# Altium footprint library Connector_Samtec_HLE_SMD.PcbLib: 290 footprints (part 16 of 24) (continued)
## Samtec_HLE-139-02-xxx-DV-BE-LC_2x39_P2.54mm_Horizontal [mm] (continued)
F.CrtYd:
  lines w0.05: -50.03,-4.06 50.03,-4.06 50.03,4.06 -50.03,4.06 -50.03,-4.06
F.Fab:
  lines w0.1: -48.76,2.54 -48.26,1.833 -47.76,2.54 ; -49.53,-2.54 -49.53,2.54 49.53,2.54 49.53,-2.54 -49.53,-2.54
  text "'.Designator'" at -4.047,-2.68 h1

## Samtec_HLE-139-02-xxx-DV-BE_2x39_P2.54mm_Horizontal [mm]
pads (156):
  rect 1.27x1.68 smd: 1(-48.26,2.72) 2(-48.26,-2.72) 3(-45.72,2.72) 4(-45.72,-2.72) 5(-43.18,2.72) 6(-43.18,-2.72) 7(-40.64,2.72) 8(-40.64,-2.72) 9(-38.1,2.72) 10(-38.1,-2.72) 11(-35.56,2.72) 12(-35.56,-2.72) 13(-33.02,2.72) 14(-33.02,-2.72) 15(-30.48,2.72) 16(-30.48,-2.72) 17(-27.94,2.72) 18(-27.94,-2.72) 19(-25.4,2.72) 20(-25.4,-2.72) 21(-22.86,2.72) 22(-22.86,-2.72) 23(-20.32,2.72) 24(-20.32,-2.72) 25(-17.78,2.72) 26(-17.78,-2.72) 27(-15.24,2.72) 28(-15.24,-2.72) 29(-12.7,2.72) 30(-12.7,-2.72) 31(-10.16,2.72) 32(-10.16,-2.72) 33(-7.62,2.72) 34(-7.62,-2.72) 35(-5.08,2.72) 36(-5.08,-2.72) 37(-2.54,2.72) 38(-2.54,-2.72) 39(0,2.72) 40(0,-2.72) 41(2.54,2.72) 42(2.54,-2.72) 43(5.08,2.72) 44(5.08,-2.72) 45(7.62,2.72) 46(7.62,-2.72) 47(10.16,2.72) 48(10.16,-2.72) 49(12.7,2.72) 50(12.7,-2.72) 51(15.24,2.72) 52(15.24,-2.72) 53(17.78,2.72) 54(17.78,-2.72) 55(20.32,2.72) 56(20.32,-2.72) 57(22.86,2.72) 58(22.86,-2.72) 59(25.4,2.72) 60(25.4,-2.72) 61(27.94,2.72) 62(27.94,-2.72) 63(30.48,2.72) 64(30.48,-2.72) 65(33.02,2.72) 66(33.02,-2.72) 67(35.56,2.72) 68(35.56,-2.72) 69(38.1,2.72) 70(38.1,-2.72) 71(40.64,2.72) 72(40.64,-2.72) 73(43.18,2.72) 74(43.18,-2.72) 75(45.72,2.72) 76(45.72,-2.72) 77(48.26,2.72) 78(48.26,-2.72)
  round 0.97 hole 0.97: Un1(30.48,-1.27) Un2(-12.7,-1.27) Un3(27.94,-1.27) Un4(-33.02,-1.27) Un5(20.32,-1.27) Un6(10.16,-1.27) Un7(0,-1.27) Un8(-25.4,-1.27) Un9(12.7,-1.27) Un10(48.26,-1.27) Un11(25.4,-1.27) Un12(15.24,-1.27) Un13(-2.54,1.27) Un14(15.24,1.27) Un15(22.86,-1.27) Un16(-43.18,-1.27) Un17(5.08,1.27) Un18(-43.18,1.27) Un19(7.62,-1.27) Un20(-30.48,-1.27) Un21(-10.16,1.27) Un22(-48.26,-1.27) Un23(-20.32,-1.27) Un24(-40.64,-1.27) Un25(-15.24,1.27) Un26(-35.56,-1.27) Un27(-27.94,1.27) Un28(-48.26,1.27) Un29(-38.1,-1.27) Un30(40.64,1.27) Un31(-2.54,-1.27) Un32(10.16,1.27) Un33(17.78,1.27) Un34(-5.08,-1.27) Un35(48.26,1.27) Un36(-12.7,1.27) Un37(38.1,1.27) Un38(-45.72,1.27) Un39(43.18,-1.27) Un40(45.72,-1.27) Un41(-20.32,1.27) Un42(-45.72,-1.27) Un43(30.48,1.27) Un44(-17.78,-1.27) Un45(33.02,1.27) Un46(35.56,-1.27) Un47(22.86,1.27) Un48(-17.78,1.27) Un49(33.02,-1.27) Un50(0,1.27) Un51(40.64,-1.27) Un52(-22.86,1.27) Un53(-25.4,1.27) Un54(-35.56,1.27) Un55(43.18,1.27) Un56(20.32,1.27) Un57(38.1,-1.27) Un58(-15.24,-1.27) Un59(-40.64,1.27) Un60(-5.08,1.27) Un61(17.78,-1.27) Un62(-22.86,-1.27) Un63(-33.02,1.27) Un64(45.72,1.27) Un65(7.62,1.27) Un66(35.56,1.27) Un67(-30.48,1.27) Un68(12.7,1.27) Un69(-10.16,-1.27) Un70(25.4,1.27) Un71(27.94,1.27) Un72(2.54,1.27) Un73(2.54,-1.27) Un74(-38.1,1.27) Un75(5.08,-1.27) Un76(-27.94,-1.27) Un77(-7.62,1.27) Un78(-7.62,-1.27)
F.SilkS:
  lines w0.12: -49.155,-2.65 -49.64,-2.65 -49.64,2.65 -49.155,2.65 -49.155,3.56 ; -47.365,-2.65 -46.615,-2.65 ; -47.365,2.65 -46.615,2.65 ; -44.825,-2.65 -44.075,-2.65 ; -44.825,2.65 -44.075,2.65 ; -42.285,-2.65 -41.535,-2.65 ; -42.285,2.65 -41.535,2.65 ; -39.745,-2.65 -38.995,-2.65 ; -39.745,2.65 -38.995,2.65 ; -37.205,-2.65 -36.455,-2.65 ; -37.205,2.65 -36.455,2.65 ; -34.665,-2.65 -33.915,-2.65 ; -34.665,2.65 -33.915,2.65 ; -32.125,-2.65 -31.375,-2.65 ; -32.125,2.65 -31.375,2.65 ; -29.585,-2.65 -28.835,-2.65 ; -29.585,2.65 -28.835,2.65 ; -27.045,-2.65 -26.295,-2.65 ; -27.045,2.65 -26.295,2.65 ; -24.505,-2.65 -23.755,-2.65 ; -24.505,2.65 -23.755,2.65 ; -21.965,-2.65 -21.215,-2.65 ; -21.965,2.65 -21.215,2.65 ; -19.425,-2.65 -18.675,-2.65 ; -19.425,2.65 -18.675,2.65 ; -16.885,-2.65 -16.135,-2.65 ; -16.885,2.65 -16.135,2.65 ; -14.345,-2.65 -13.595,-2.65 ; -14.345,2.65 -13.595,2.65 ; -11.805,-2.65 -11.055,-2.65 ; -11.805,2.65 -11.055,2.65 ; -9.265,-2.65 -8.515,-2.65 ; -9.265,2.65 -8.515,2.65 ; -6.725,-2.65 -5.975,-2.65 ; -6.725,2.65 -5.975,2.65 ; -4.185,-2.65 -3.435,-2.65 ; -4.185,2.65 -3.435,2.65 ; -1.645,-2.65 -0.895,-2.65 ; -1.645,2.65 -0.895,2.65 ; 0.895,-2.65 1.645,-2.65 ; 0.895,2.65 1.645,2.65 ; 3.435,-2.65 4.185,-2.65 ; 3.435,2.65 4.185,2.65 ; 5.975,-2.65 6.725,-2.65 ; 5.975,2.65 6.725,2.65 ; 8.515,-2.65 9.265,-2.65 ; 8.515,2.65 9.265,2.65 ; 11.055,-2.65 11.805,-2.65 ; 11.055,2.65 11.805,2.65 ; 13.595,-2.65 14.345,-2.65 ; 13.595,2.65 14.345,2.65 ; 16.135,-2.65 16.885,-2.65 ; 16.135,2.65 16.885,2.65 ; 18.675,-2.65 19.425,-2.65 ; 18.675,2.65 19.425,2.65 ; 21.215,-2.65 21.965,-2.65 ; 21.215,2.65 21.965,2.65 ; 23.755,-2.65 24.505,-2.65 ; 23.755,2.65 24.505,2.65 ; 26.295,-2.65 27.045,-2.65 ; 26.295,2.65 27.045,2.65 ; 28.835,-2.65 29.585,-2.65 ; 28.835,2.65 29.585,2.65 ; 31.375,-2.65 32.125,-2.65 ; 31.375,2.65 32.125,2.65 ; 33.915,-2.65 34.665,-2.65 ; 33.915,2.65 34.665,2.65 ; 36.455,-2.65 37.205,-2.65 ; 36.455,2.65 37.205,2.65 ; 38.995,-2.65 39.745,-2.65 ; 38.995,2.65 39.745,2.65 ; 41.535,-2.65 42.285,-2.65 ; 41.535,2.65 42.285,2.65 ; 44.075,-2.65 44.825,-2.65 ; 44.075,2.65 44.825,2.65 ; 46.615,-2.65 47.365,-2.65 ; 46.615,2.65 47.365,2.65 ; 49.155,-2.65 49.64,-2.65 49.64,2.65 49.155,2.65
F.CrtYd:
  lines w0.05: -50.03,-4.06 50.03,-4.06 50.03,4.06 -50.03,4.06 -50.03,-4.06
F.Fab:
  lines w0.1: -48.76,2.54 -48.26,1.833 -47.76,2.54 ; -49.53,-2.54 -49.53,2.54 49.53,2.54 49.53,-2.54 -49.53,-2.54
  text "'.Designator'" at -4.047,-2.68 h1

## Samtec_HLE-139-02-xxx-DV-LC_2x39_P2.54mm_Horizontal [mm]
pads (80):
  rect 1.27x2.29 smd: 1(-48.26,2.525) 2(-48.26,-2.525) 3(-45.72,2.525) 4(-45.72,-2.525) 5(-43.18,2.525) 6(-43.18,-2.525) 7(-40.64,2.525) 8(-40.64,-2.525) 9(-38.1,2.525) 10(-38.1,-2.525) 11(-35.56,2.525) 12(-35.56,-2.525) 13(-33.02,2.525) 14(-33.02,-2.525) 15(-30.48,2.525) 16(-30.48,-2.525) 17(-27.94,2.525) 18(-27.94,-2.525) 19(-25.4,2.525) 20(-25.4,-2.525) 21(-22.86,2.525) 22(-22.86,-2.525) 23(-20.32,2.525) 24(-20.32,-2.525) 25(-17.78,2.525) 26(-17.78,-2.525) 27(-15.24,2.525) 28(-15.24,-2.525) 29(-12.7,2.525) 30(-12.7,-2.525) 31(-10.16,2.525) 32(-10.16,-2.525) 33(-7.62,2.525) 34(-7.62,-2.525) 35(-5.08,2.525) 36(-5.08,-2.525) 37(-2.54,2.525) 38(-2.54,-2.525) 39(0,2.525) 40(0,-2.525) 41(2.54,2.525) 42(2.54,-2.525) 43(5.08,2.525) 44(5.08,-2.525) 45(7.62,2.525) 46(7.62,-2.525) 47(10.16,2.525) 48(10.16,-2.525) 49(12.7,2.525) 50(12.7,-2.525) 51(15.24,2.525) 52(15.24,-2.525) 53(17.78,2.525) 54(17.78,-2.525) 55(20.32,2.525) 56(20.32,-2.525) 57(22.86,2.525) 58(22.86,-2.525) 59(25.4,2.525) 60(25.4,-2.525) 61(27.94,2.525) 62(27.94,-2.525) 63(30.48,2.525) 64(30.48,-2.525) 65(33.02,2.525) 66(33.02,-2.525) 67(35.56,2.525) 68(35.56,-2.525) 69(38.1,2.525) 70(38.1,-2.525) 71(40.64,2.525) 72(40.64,-2.525) 73(43.18,2.525) 74(43.18,-2.525) 75(45.72,2.525) 76(45.72,-2.525) 77(48.26,2.525) 78(48.26,-2.525)
  round 1.19 hole 1.19: Un1(-46.99,0) Un2(46.99,0)
F.SilkS:
  lines w0.12: -49.155,-2.65 -49.64,-2.65 -49.64,2.65 -49.155,2.65 -49.155,3.67 ; -47.365,-2.65 -46.615,-2.65 ; -47.365,2.65 -46.615,2.65 ; -44.825,-2.65 -44.075,-2.65 ; -44.825,2.65 -44.075,2.65 ; -42.285,-2.65 -41.535,-2.65 ; -42.285,2.65 -41.535,2.65 ; -39.745,-2.65 -38.995,-2.65 ; -39.745,2.65 -38.995,2.65 ; -37.205,-2.65 -36.455,-2.65 ; -37.205,2.65 -36.455,2.65 ; -34.665,-2.65 -33.915,-2.65 ; -34.665,2.65 -33.915,2.65 ; -32.125,-2.65 -31.375,-2.65 ; -32.125,2.65 -31.375,2.65 ; -29.585,-2.65 -28.835,-2.65 ; -29.585,2.65 -28.835,2.65 ; -27.045,-2.65 -26.295,-2.65 ; -27.045,2.65 -26.295,2.65 ; -24.505,-2.65 -23.755,-2.65 ; -24.505,2.65 -23.755,2.65 ; -21.965,-2.65 -21.215,-2.65 ; -21.965,2.65 -21.215,2.65 ; -19.425,-2.65 -18.675,-2.65 ; -19.425,2.65 -18.675,2.65 ; -16.885,-2.65 -16.135,-2.65 ; -16.885,2.65 -16.135,2.65 ; -14.345,-2.65 -13.595,-2.65 ; -14.345,2.65 -13.595,2.65 ; -11.805,-2.65 -11.055,-2.65 ; -11.805,2.65 -11.055,2.65 ; -9.265,-2.65 -8.515,-2.65 ; -9.265,2.65 -8.515,2.65 ; -6.725,-2.65 -5.975,-2.65 ; -6.725,2.65 -5.975,2.65 ; -4.185,-2.65 -3.435,-2.65 ; -4.185,2.65 -3.435,2.65 ; -1.645,-2.65 -0.895,-2.65 ; -1.645,2.65 -0.895,2.65 ; 0.895,-2.65 1.645,-2.65 ; 0.895,2.65 1.645,2.65 ; 3.435,-2.65 4.185,-2.65 ; 3.435,2.65 4.185,2.65 ; 5.975,-2.65 6.725,-2.65 ; 5.975,2.65 6.725,2.65 ; 8.515,-2.65 9.265,-2.65 ; 8.515,2.65 9.265,2.65 ; 11.055,-2.65 11.805,-2.65 ; 11.055,2.65 11.805,2.65 ; 13.595,-2.65 14.345,-2.65 ; 13.595,2.65 14.345,2.65 ; 16.135,-2.65 16.885,-2.65 ; 16.135,2.65 16.885,2.65 ; 18.675,-2.65 19.425,-2.65 ; 18.675,2.65 19.425,2.65 ; 21.215,-2.65 21.965,-2.65 ; 21.215,2.65 21.965,2.65 ; 23.755,-2.65 24.505,-2.65 ; 23.755,2.65 24.505,2.65 ; 26.295,-2.65 27.045,-2.65 ; 26.295,2.65 27.045,2.65 ; 28.835,-2.65 29.585,-2.65 ; 28.835,2.65 29.585,2.65 ; 31.375,-2.65 32.125,-2.65 ; 31.375,2.65 32.125,2.65 ; 33.915,-2.65 34.665,-2.65 ; 33.915,2.65 34.665,2.65 ; 36.455,-2.65 37.205,-2.65 ; 36.455,2.65 37.205,2.65 ; 38.995,-2.65 39.745,-2.65 ; 38.995,2.65 39.745,2.65 ; 41.535,-2.65 42.285,-2.65 ; 41.535,2.65 42.285,2.65 ; 44.075,-2.65 44.825,-2.65 ; 44.075,2.65 44.825,2.65 ; 46.615,-2.65 47.365,-2.65 ; 46.615,2.65 47.365,2.65 ; 49.155,-2.65 49.64,-2.65 49.64,2.65 49.155,2.65
F.CrtYd:
  lines w0.05: -50.03,-4.17 50.03,-4.17 50.03,4.17 -50.03,4.17 -50.03,-4.17
F.Fab:
  lines w0.1: -48.76,2.54 -48.26,1.833 -47.76,2.54 ; -49.53,-2.54 49.53,-2.54 49.53,2.54 -49.53,2.54 -49.53,-2.54
  text "'.Designator'" at -4.047,-2.68 h1

## Samtec_HLE-139-02-xxx-DV_2x39_P2.54mm_Horizontal [mm]
pads (78):
  rect 1.27x2.29 smd: 1(-48.26,2.525) 2(-48.26,-2.525) 3(-45.72,2.525) 4(-45.72,-2.525) 5(-43.18,2.525) 6(-43.18,-2.525) 7(-40.64,2.525) 8(-40.64,-2.525) 9(-38.1,2.525) 10(-38.1,-2.525) 11(-35.56,2.525) 12(-35.56,-2.525) 13(-33.02,2.525) 14(-33.02,-2.525) 15(-30.48,2.525) 16(-30.48,-2.525) 17(-27.94,2.525) 18(-27.94,-2.525) 19(-25.4,2.525) 20(-25.4,-2.525) 21(-22.86,2.525) 22(-22.86,-2.525) 23(-20.32,2.525) 24(-20.32,-2.525) 25(-17.78,2.525) 26(-17.78,-2.525) 27(-15.24,2.525) 28(-15.24,-2.525) 29(-12.7,2.525) 30(-12.7,-2.525) 31(-10.16,2.525) 32(-10.16,-2.525) 33(-7.62,2.525) 34(-7.62,-2.525) 35(-5.08,2.525) 36(-5.08,-2.525) 37(-2.54,2.525) 38(-2.54,-2.525) 39(0,2.525) 40(0,-2.525) 41(2.54,2.525) 42(2.54,-2.525) 43(5.08,2.525) 44(5.08,-2.525) 45(7.62,2.525) 46(7.62,-2.525) 47(10.16,2.525) 48(10.16,-2.525) 49(12.7,2.525) 50(12.7,-2.525) 51(15.24,2.525) 52(15.24,-2.525) 53(17.78,2.525) 54(17.78,-2.525) 55(20.32,2.525) 56(20.32,-2.525) 57(22.86,2.525) 58(22.86,-2.525) 59(25.4,2.525) 60(25.4,-2.525) 61(27.94,2.525) 62(27.94,-2.525) 63(30.48,2.525) 64(30.48,-2.525) 65(33.02,2.525) 66(33.02,-2.525) 67(35.56,2.525) 68(35.56,-2.525) 69(38.1,2.525) 70(38.1,-2.525) 71(40.64,2.525) 72(40.64,-2.525) 73(43.18,2.525) 74(43.18,-2.525) 75(45.72,2.525) 76(45.72,-2.525) 77(48.26,2.525) 78(48.26,-2.525)
F.SilkS:
  lines w0.12: -49.155,-2.65 -49.64,-2.65 -49.64,2.65 -49.155,2.65 -49.155,3.67 ; -47.365,-2.65 -46.615,-2.65 ; -47.365,2.65 -46.615,2.65 ; -44.825,-2.65 -44.075,-2.65 ; -44.825,2.65 -44.075,2.65 ; -42.285,-2.65 -41.535,-2.65 ; -42.285,2.65 -41.535,2.65 ; -39.745,-2.65 -38.995,-2.65 ; -39.745,2.65 -38.995,2.65 ; -37.205,-2.65 -36.455,-2.65 ; -37.205,2.65 -36.455,2.65 ; -34.665,-2.65 -33.915,-2.65 ; -34.665,2.65 -33.915,2.65 ; -32.125,-2.65 -31.375,-2.65 ; -32.125,2.65 -31.375,2.65 ; -29.585,-2.65 -28.835,-2.65 ; -29.585,2.65 -28.835,2.65 ; -27.045,-2.65 -26.295,-2.65 ; -27.045,2.65 -26.295,2.65 ; -24.505,-2.65 -23.755,-2.65 ; -24.505,2.65 -23.755,2.65 ; -21.965,-2.65 -21.215,-2.65 ; -21.965,2.65 -21.215,2.65 ; -19.425,-2.65 -18.675,-2.65 ; -19.425,2.65 -18.675,2.65 ; -16.885,-2.65 -16.135,-2.65 ; -16.885,2.65 -16.135,2.65 ; -14.345,-2.65 -13.595,-2.65 ; -14.345,2.65 -13.595,2.65 ; -11.805,-2.65 -11.055,-2.65 ; -11.805,2.65 -11.055,2.65 ; -9.265,-2.65 -8.515,-2.65 ; -9.265,2.65 -8.515,2.65 ; -6.725,-2.65 -5.975,-2.65 ; -6.725,2.65 -5.975,2.65 ; -4.185,-2.65 -3.435,-2.65 ; -4.185,2.65 -3.435,2.65 ; -1.645,-2.65 -0.895,-2.65 ; -1.645,2.65 -0.895,2.65 ; 0.895,-2.65 1.645,-2.65 ; 0.895,2.65 1.645,2.65 ; 3.435,-2.65 4.185,-2.65 ; 3.435,2.65 4.185,2.65 ; 5.975,-2.65 6.725,-2.65 ; 5.975,2.65 6.725,2.65 ; 8.515,-2.65 9.265,-2.65 ; 8.515,2.65 9.265,2.65 ; 11.055,-2.65 11.805,-2.65 ; 11.055,2.65 11.805,2.65 ; 13.595,-2.65 14.345,-2.65 ; 13.595,2.65 14.345,2.65 ; 16.135,-2.65 16.885,-2.65 ; 16.135,2.65 16.885,2.65 ; 18.675,-2.65 19.425,-2.65 ; 18.675,2.65 19.425,2.65 ; 21.215,-2.65 21.965,-2.65 ; 21.215,2.65 21.965,2.65 ; 23.755,-2.65 24.505,-2.65 ; 23.755,2.65 24.505,2.65 ; 26.295,-2.65 27.045,-2.65 ; 26.295,2.65 27.045,2.65 ; 28.835,-2.65 29.585,-2.65 ; 28.835,2.65 29.585,2.65 ; 31.375,-2.65 32.125,-2.65 ; 31.375,2.65 32.125,2.65 ; 33.915,-2.65 34.665,-2.65 ; 33.915,2.65 34.665,2.65 ; 36.455,-2.65 37.205,-2.65 ; 36.455,2.65 37.205,2.65 ; 38.995,-2.65 39.745,-2.65 ; 38.995,2.65 39.745,2.65 ; 41.535,-2.65 42.285,-2.65 ; 41.535,2.65 42.285,2.65 ; 44.075,-2.65 44.825,-2.65 ; 44.075,2.65 44.825,2.65 ; 46.615,-2.65 47.365,-2.65 ; 46.615,2.65 47.365,2.65 ; 49.155,-2.65 49.64,-2.65 49.64,2.65 49.155,2.65
F.CrtYd:
  lines w0.05: -50.03,-4.17 -50.03,4.17 50.03,4.17 50.03,-4.17 -50.03,-4.17
F.Fab:
  lines w0.1: -48.76,2.54 -48.26,1.833 -47.76,2.54 ; -49.53,-2.54 -49.53,2.54 49.53,2.54 49.53,-2.54 -49.53,-2.54
  text "'.Designator'" at -4.047,-2.68 h1

## Samtec_HLE-140-02-xxx-DV-A_2x40_P2.54mm_Horizontal [mm]
pads (82):
  rect 1.27x2.29 smd: 1(-49.53,2.525) 2(-49.53,-2.525) 3(-46.99,2.525) 4(-46.99,-2.525) 5(-44.45,2.525) 6(-44.45,-2.525) 7(-41.91,2.525) 8(-41.91,-2.525) 9(-39.37,2.525) 10(-39.37,-2.525) 11(-36.83,2.525) 12(-36.83,-2.525) 13(-34.29,2.525) 14(-34.29,-2.525) 15(-31.75,2.525) 16(-31.75,-2.525) 17(-29.21,2.525) 18(-29.21,-2.525) 19(-26.67,2.525) 20(-26.67,-2.525) 21(-24.13,2.525) 22(-24.13,-2.525) 23(-21.59,2.525) 24(-21.59,-2.525) 25(-19.05,2.525) 26(-19.05,-2.525) 27(-16.51,2.525) 28(-16.51,-2.525) 29(-13.97,2.525) 30(-13.97,-2.525) 31(-11.43,2.525) 32(-11.43,-2.525) 33(-8.89,2.525) 34(-8.89,-2.525) 35(-6.35,2.525) 36(-6.35,-2.525) 37(-3.81,2.525) 38(-3.81,-2.525) 39(-1.27,2.525) 40(-1.27,-2.525) 41(1.27,2.525) 42(1.27,-2.525) 43(3.81,2.525) 44(3.81,-2.525) 45(6.35,2.525) 46(6.35,-2.525) 47(8.89,2.525) 48(8.89,-2.525) 49(11.43,2.525) 50(11.43,-2.525) 51(13.97,2.525) 52(13.97,-2.525) 53(16.51,2.525) 54(16.51,-2.525) 55(19.05,2.525) 56(19.05,-2.525) 57(21.59,2.525) 58(21.59,-2.525) 59(24.13,2.525) 60(24.13,-2.525) 61(26.67,2.525) 62(26.67,-2.525) 63(29.21,2.525) 64(29.21,-2.525) 65(31.75,2.525) 66(31.75,-2.525) 67(34.29,2.525) 68(34.29,-2.525) 69(36.83,2.525) 70(36.83,-2.525) 71(39.37,2.525) 72(39.37,-2.525) 73(41.91,2.525) 74(41.91,-2.525) 75(44.45,2.525) 76(44.45,-2.525) 77(46.99,2.525) 78(46.99,-2.525) 79(49.53,2.525) 80(49.53,-2.525)
  round 1.78 hole 1.78: Un1(-48.26,0) Un2(48.26,0)
F.SilkS:
  lines w0.12: -50.425,-2.65 -50.91,-2.65 -50.91,2.65 -50.425,2.65 -50.425,3.67 ; -48.635,-2.65 -47.885,-2.65 ; -48.635,2.65 -47.885,2.65 ; -46.095,-2.65 -45.345,-2.65 ; -46.095,2.65 -45.345,2.65 ; -43.555,-2.65 -42.805,-2.65 ; -43.555,2.65 -42.805,2.65 ; -41.015,-2.65 -40.265,-2.65 ; -41.015,2.65 -40.265,2.65 ; -38.475,-2.65 -37.725,-2.65 ; -38.475,2.65 -37.725,2.65 ; -35.935,-2.65 -35.185,-2.65 ; -35.935,2.65 -35.185,2.65 ; -33.395,-2.65 -32.645,-2.65 ; -33.395,2.65 -32.645,2.65 ; -30.855,-2.65 -30.105,-2.65 ; -30.855,2.65 -30.105,2.65 ; -28.315,-2.65 -27.565,-2.65 ; -28.315,2.65 -27.565,2.65 ; -25.775,-2.65 -25.025,-2.65 ; -25.775,2.65 -25.025,2.65 ; -23.235,-2.65 -22.485,-2.65 ; -23.235,2.65 -22.485,2.65 ; -20.695,-2.65 -19.945,-2.65 ; -20.695,2.65 -19.945,2.65 ; -18.155,-2.65 -17.405,-2.65 ; -18.155,2.65 -17.405,2.65 ; -15.615,-2.65 -14.865,-2.65 ; -15.615,2.65 -14.865,2.65 ; -13.075,-2.65 -12.325,-2.65 ; -13.075,2.65 -12.325,2.65 ; -10.535,-2.65 -9.785,-2.65 ; -10.535,2.65 -9.785,2.65 ; -7.995,-2.65 -7.245,-2.65 ; -7.995,2.65 -7.245,2.65 ; -5.455,-2.65 -4.705,-2.65 ; -5.455,2.65 -4.705,2.65 ; -2.915,-2.65 -2.165,-2.65 ; -2.915,2.65 -2.165,2.65 ; -0.375,-2.65 0.375,-2.65 ; -0.375,2.65 0.375,2.65 ; 2.165,-2.65 2.915,-2.65 ; 2.165,2.65 2.915,2.65 ; 4.705,-2.65 5.455,-2.65 ; 4.705,2.65 5.455,2.65 ; 7.245,-2.65 7.995,-2.65 ; 7.245,2.65 7.995,2.65 ; 9.785,-2.65 10.535,-2.65 ; 9.785,2.65 10.535,2.65 ; 12.325,-2.65 13.075,-2.65 ; 12.325,2.65 13.075,2.65 ; 14.865,-2.65 15.615,-2.65 ; 14.865,2.65 15.615,2.65 ; 17.405,-2.65 18.155,-2.65 ; 17.405,2.65 18.155,2.65 ; 19.945,-2.65 20.695,-2.65 ; 19.945,2.65 20.695,2.65 ; 22.485,-2.65 23.235,-2.65 ; 22.485,2.65 23.235,2.65 ; 25.025,-2.65 25.775,-2.65 ; 25.025,2.65 25.775,2.65 ; 27.565,-2.65 28.315,-2.65 ; 27.565,2.65 28.315,2.65 ; 30.105,-2.65 30.855,-2.65 ; 30.105,2.65 30.855,2.65 ; 32.645,-2.65 33.395,-2.65 ; 32.645,2.65 33.395,2.65 ; 35.185,-2.65 35.935,-2.65 ; 35.185,2.65 35.935,2.65 ; 37.725,-2.65 38.475,-2.65 ; 37.725,2.65 38.475,2.65 ; 40.265,-2.65 41.015,-2.65 ; 40.265,2.65 41.015,2.65 ; 42.805,-2.65 43.555,-2.65 ; 42.805,2.65 43.555,2.65 ; 45.345,-2.65 46.095,-2.65 ; 45.345,2.65 46.095,2.65 ; 47.885,-2.65 48.635,-2.65 ; 47.885,2.65 48.635,2.65 ; 50.425,-2.65 50.91,-2.65 50.91,2.65 50.425,2.65
F.CrtYd:
  lines w0.05: -51.3,-4.17 51.3,-4.17 51.3,4.17 -51.3,4.17 -51.3,-4.17
F.Fab:
  lines w0.1: -50.03,2.54 -49.53,1.833 -49.03,2.54 ; -50.8,-2.54 -50.8,2.54 50.8,2.54 50.8,-2.54 -50.8,-2.54
  text "'.Designator'" at -4.047,-2.68 h1

## Samtec_HLE-140-02-xxx-DV-BE-A_2x40_P2.54mm_Horizontal [mm]
pads (162):
  rect 1.27x1.68 smd: 1(-49.53,2.72) 2(-49.53,-2.72) 3(-46.99,2.72) 4(-46.99,-2.72) 5(-44.45,2.72) 6(-44.45,-2.72) 7(-41.91,2.72) 8(-41.91,-2.72) 9(-39.37,2.72) 10(-39.37,-2.72) 11(-36.83,2.72) 12(-36.83,-2.72) 13(-34.29,2.72) 14(-34.29,-2.72) 15(-31.75,2.72) 16(-31.75,-2.72) 17(-29.21,2.72) 18(-29.21,-2.72) 19(-26.67,2.72) 20(-26.67,-2.72) 21(-24.13,2.72) 22(-24.13,-2.72) 23(-21.59,2.72) 24(-21.59,-2.72) 25(-19.05,2.72) 26(-19.05,-2.72) 27(-16.51,2.72) 28(-16.51,-2.72) 29(-13.97,2.72) 30(-13.97,-2.72) 31(-11.43,2.72) 32(-11.43,-2.72) 33(-8.89,2.72) 34(-8.89,-2.72) 35(-6.35,2.72) 36(-6.35,-2.72) 37(-3.81,2.72) 38(-3.81,-2.72) 39(-1.27,2.72) 40(-1.27,-2.72) 41(1.27,2.72) 42(1.27,-2.72) 43(3.81,2.72) 44(3.81,-2.72) 45(6.35,2.72) 46(6.35,-2.72) 47(8.89,2.72) 48(8.89,-2.72) 49(11.43,2.72) 50(11.43,-2.72) 51(13.97,2.72) 52(13.97,-2.72) 53(16.51,2.72) 54(16.51,-2.72) 55(19.05,2.72) 56(19.05,-2.72) 57(21.59,2.72) 58(21.59,-2.72) 59(24.13,2.72) 60(24.13,-2.72) 61(26.67,2.72) 62(26.67,-2.72) 63(29.21,2.72) 64(29.21,-2.72) 65(31.75,2.72) 66(31.75,-2.72) 67(34.29,2.72) 68(34.29,-2.72) 69(36.83,2.72) 70(36.83,-2.72) 71(39.37,2.72) 72(39.37,-2.72) 73(41.91,2.72) 74(41.91,-2.72) 75(44.45,2.72) 76(44.45,-2.72) 77(46.99,2.72) 78(46.99,-2.72) 79(49.53,2.72) 80(49.53,-2.72)
  round 0.97 hole 0.97: Un1(49.53,1.27) Un2(-39.37,-1.27) Un3(31.75,1.27) Un4(-31.75,1.27) Un5(-16.51,-1.27) Un6(-3.81,1.27) Un7(-41.91,-1.27) Un8(-6.35,1.27) Un9(36.83,-1.27) Un10(29.21,1.27) Un11(-6.35,-1.27) Un12(-11.43,-1.27) Un13(41.91,1.27) Un14(-49.53,-1.27) Un15(-26.67,-1.27) Un16(-13.97,-1.27) Un17(-39.37,1.27) Un18(44.45,1.27) Un19(-44.45,-1.27) Un20(26.67,1.27) Un21(6.35,-1.27) Un22(11.43,1.27) Un23(13.97,1.27) Un24(-34.29,1.27) Un25(19.05,1.27) Un26(-3.81,-1.27) Un27(-44.45,1.27) Un28(-21.59,-1.27) Un29(-31.75,-1.27) Un30(21.59,1.27) Un31(-41.91,1.27) Un32(24.13,1.27) Un33(-1.27,1.27) Un34(49.53,-1.27) Un35(44.45,-1.27) Un36(-21.59,1.27) Un37(16.51,1.27) Un38(-13.97,1.27) Un39(-34.29,-1.27) Un40(21.59,-1.27) Un41(-11.43,1.27) Un42(39.37,1.27) Un43(-46.99,1.27) Un44(46.99,-1.27) Un45(-8.89,-1.27) Un47(29.21,-1.27) Un48(-19.05,1.27) Un49(31.75,-1.27) Un50(1.27,1.27) Un51(16.51,-1.27) Un52(-8.89,1.27) Un53(-49.53,1.27) Un54(-1.27,-1.27) Un55(-24.13,1.27) Un56(19.05,-1.27) Un57(39.37,-1.27) Un58(-29.21,1.27) Un59(-46.99,-1.27) Un60(6.35,1.27) Un61(8.89,1.27) Un62(34.29,1.27) Un63(46.99,1.27) Un64(3.81,-1.27) Un66(24.13,-1.27) Un67(-19.05,-1.27) Un68(-29.21,-1.27) Un69(41.91,-1.27) Un70(-16.51,1.27) Un71(1.27,-1.27) Un72(26.67,-1.27) Un73(11.43,-1.27) Un74(8.89,-1.27) Un75(-24.13,-1.27) Un76(-36.83,-1.27) Un77(3.81,1.27) Un78(13.97,-1.27) Un79(36.83,1.27) Un80(34.29,-1.27) Un81(-36.83,1.27) Un82(-26.67,1.27)
  round 1.78 hole 1.78: Un46(-48.26,0) Un65(48.26,0)
F.SilkS:
  lines w0.12: -50.425,-2.65 -50.91,-2.65 -50.91,2.65 -50.425,2.65 -50.425,3.56 ; -48.635,-2.65 -47.885,-2.65 ; -48.635,2.65 -47.885,2.65 ; -46.095,-2.65 -45.345,-2.65 ; -46.095,2.65 -45.345,2.65 ; -43.555,-2.65 -42.805,-2.65 ; -43.555,2.65 -42.805,2.65 ; -41.015,-2.65 -40.265,-2.65 ; -41.015,2.65 -40.265,2.65 ; -38.475,-2.65 -37.725,-2.65 ; -38.475,2.65 -37.725,2.65 ; -35.935,-2.65 -35.185,-2.65 ; -35.935,2.65 -35.185,2.65 ; -33.395,-2.65 -32.645,-2.65 ; -33.395,2.65 -32.645,2.65 ; -30.855,-2.65 -30.105,-2.65 ; -30.855,2.65 -30.105,2.65 ; -28.315,-2.65 -27.565,-2.65 ; -28.315,2.65 -27.565,2.65 ; -25.775,-2.65 -25.025,-2.65 ; -25.775,2.65 -25.025,2.65 ; -23.235,-2.65 -22.485,-2.65 ; -23.235,2.65 -22.485,2.65 ; -20.695,-2.65 -19.945,-2.65 ; -20.695,2.65 -19.945,2.65 ; -18.155,-2.65 -17.405,-2.65 ; -18.155,2.65 -17.405,2.65 ; -15.615,-2.65 -14.865,-2.65 ; -15.615,2.65 -14.865,2.65 ; -13.075,-2.65 -12.325,-2.65 ; -13.075,2.65 -12.325,2.65 ; -10.535,-2.65 -9.785,-2.65 ; -10.535,2.65 -9.785,2.65 ; -7.995,-2.65 -7.245,-2.65 ; -7.995,2.65 -7.245,2.65 ; -5.455,-2.65 -4.705,-2.65 ; -5.455,2.65 -4.705,2.65 ; -2.915,-2.65 -2.165,-2.65 ; -2.915,2.65 -2.165,2.65 ; -0.375,-2.65 0.375,-2.65 ; -0.375,2.65 0.375,2.65 ; 2.165,-2.65 2.915,-2.65 ; 2.165,2.65 2.915,2.65 ; 4.705,-2.65 5.455,-2.65 ; 4.705,2.65 5.455,2.65 ; 7.245,-2.65 7.995,-2.65 ; 7.245,2.65 7.995,2.65 ; 9.785,-2.65 10.535,-2.65 ; 9.785,2.65 10.535,2.65 ; 12.325,-2.65 13.075,-2.65 ; 12.325,2.65 13.075,2.65 ; 14.865,-2.65 15.615,-2.65 ; 14.865,2.65 15.615,2.65 ; 17.405,-2.65 18.155,-2.65 ; 17.405,2.65 18.155,2.65 ; 19.945,-2.65 20.695,-2.65 ; 19.945,2.65 20.695,2.65 ; 22.485,-2.65 23.235,-2.65 ; 22.485,2.65 23.235,2.65 ; 25.025,-2.65 25.775,-2.65 ; 25.025,2.65 25.775,2.65 ; 27.565,-2.65 28.315,-2.65 ; 27.565,2.65 28.315,2.65 ; 30.105,-2.65 30.855,-2.65 ; 30.105,2.65 30.855,2.65 ; 32.645,-2.65 33.395,-2.65 ; 32.645,2.65 33.395,2.65 ; 35.185,-2.65 35.935,-2.65 ; 35.185,2.65 35.935,2.65 ; 37.725,-2.65 38.475,-2.65 ; 37.725,2.65 38.475,2.65 ; 40.265,-2.65 41.015,-2.65 ; 40.265,2.65 41.015,2.65 ; 42.805,-2.65 43.555,-2.65 ; 42.805,2.65 43.555,2.65 ; 45.345,-2.65 46.095,-2.65 ; 45.345,2.65 46.095,2.65 ; 47.885,-2.65 48.635,-2.65 ; 47.885,2.65 48.635,2.65 ; 50.425,-2.65 50.91,-2.65 50.91,2.65 50.425,2.65
F.CrtYd:
  lines w0.05: -51.3,-4.06 -51.3,4.06 51.3,4.06 51.3,-4.06 -51.3,-4.06
F.Fab:
  lines w0.1: -50.03,2.54 -49.53,1.833 -49.03,2.54 ; -50.8,-2.54 -50.8,2.54 50.8,2.54 50.8,-2.54 -50.8,-2.54
  text "'.Designator'" at -4.047,-2.68 h1